# Altium footprint library SparkFun.PCBLIB: 674 footprints (part 10 of 44)
Each footprint in its own frame and in the unit in brackets; x right, y up, seen from the top. Pads: shape width x height; smd on the part's side, far side on the other; paste and mask are expansions set on the pad; w line width, h text height; cw(c..) or ccw(c..) is an arc to the next point about the centre after c.
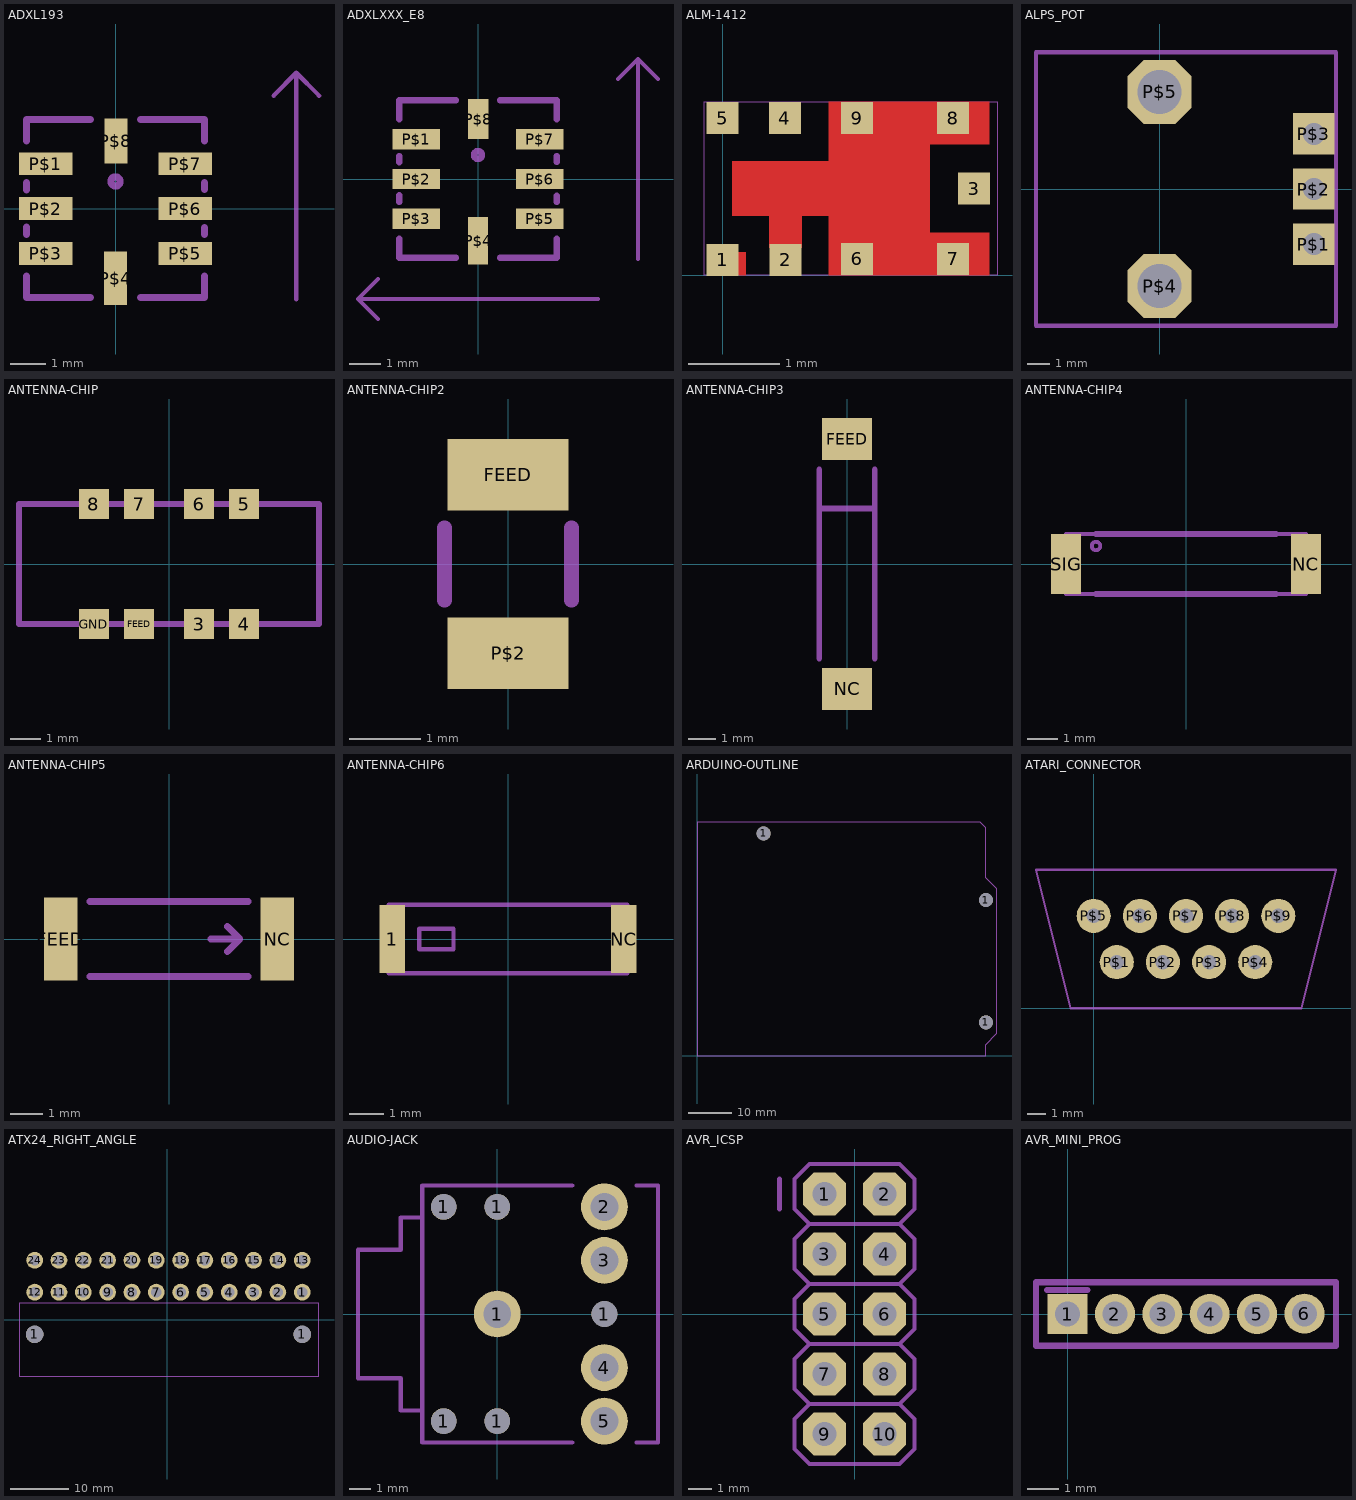
[diagram p9: the footprints below, top view; thin cyan lines are the x and y axes]

## ADXL193 [mil]
pads (8):
  rect 59.06x25.2 smd: P$1(-77.17,49.61) P$2(-77.17,0) P$3(-77.17,-49.61) P$5(77.17,-49.61) P$6(77.17,0) P$7(77.17,49.61)
  rect 25.2x59.06 smd: P$4(0,-77.17)
  rect 25.2x50 smd: P$8(0.39,74.8)
Mechanical 2:
  circle w8: c0,30 r5
  lines w8: -98.43,-74.8 -98.43,-98.43 -27.56,-98.43 ; -98.43,-28.74 -98.43,-20.47 ; -98.43,20.87 -98.43,28.74 ; -98.43,74.8 -98.43,98.43 -27.56,98.43 ; 27.56,-98.43 98.43,-98.43 98.43,-74.8 ; 27.56,98.43 98.43,98.43 98.43,74.8 ; 98.43,-28.74 98.43,-20.87 ; 98.43,21.26 98.43,28.74
Mechanical 18:
  lines w5: 175,125 200,150 ; 200,-100 200,150 ; 225,125 200,150

## ADXLXXX_E8 [mil]
pads (8):
  rect 59.06x25.2 smd: P$1(-77.17,49.61) P$2(-77.17,0) P$3(-77.17,-49.61) P$5(77.17,-49.61) P$6(77.17,0) P$7(77.17,49.61)
  rect 25.2x59.06 smd: P$4(0,-77.17)
  rect 25.2x50 smd: P$8(0.39,74.8)
Mechanical 2:
  circle w8: c0,30 r5
  lines w8: -98.43,-74.8 -98.43,-98.43 -27.56,-98.43 ; -98.43,-28.74 -98.43,-20.47 ; -98.43,20.87 -98.43,28.74 ; -98.43,74.8 -98.43,98.43 -27.56,98.43 ; 27.56,-98.43 98.43,-98.43 98.43,-74.8 ; 27.56,98.43 98.43,98.43 98.43,74.8 ; 98.43,-28.74 98.43,-20.87 ; 98.43,21.26 98.43,28.74
Mechanical 18:
  lines w5: -125,-175 -150,-150 ; -125,-125 -150,-150 ; 150,-150 -150,-150 ; 175,125 200,150 ; 200,-100 200,150 ; 225,125 200,150

## ALM-1412 [mm]
pads (9):
  rect 0.35x0.35 smd: 1(0,0.17) 2(0.69,0.17) 3(2.75,0.95) 4(0.68,1.72) 5(0,1.72)
  rect 0.35x0.35 smd paste-0.175: 6(1.47,0.18) 7(2.52,0.18) 8(2.52,1.72) 9(1.47,1.72)
Top Layer:
  rectangle: 1.16,1.43 2.92,1.9
  rectangle: 1.16,0 2.92,0.47
  rectangle: 1.16,0.4 2.27,1.5
  rectangle: 0.1,0.65 1.76,1.25
  rectangle: 0.508,0.3 0.867,0.7
  region: 0,0 0.254,0 0.254,0.254 0,0.254
Top Paste:
  rectangle: 1.33,1.585 1.61,1.895
  rectangle: 1.86,1.585 2.12,1.895
  rectangle: 2.37,1.51 2.67,1.89
  rectangle: 1.33,0.005 1.61,0.315
  rectangle: 1.86,0.005 2.12,0.315
  rectangle: 2.37,0.01 2.67,0.39
  rectangle: 1.86,0.64 2.12,1.26
  rectangle: -0.005,0.7 0.545,1.2
  rectangle: 0.79,0.64 1.61,1.26
Top Solder:
  rectangle: 1.09,1.43 3,2
  rectangle: 1.09,-0.11 3,0.47
  rectangle: 1.09,0.47 2.27,1.43
  rectangle: -0.28,0.57 1.09,1.34
Mechanical 18:
  lines w0.01: -0.2,0 -0.2,1.9 3,1.9 3,0 -0.2,0

## ALPS_POT [mm]
pads (5):
  rect 1.88x1.88 hole 1: P$1(7,-2.5) P$2(7,0) P$3(7,2.5)
  oct 2.905x2.905 hole 2: P$4(0,-4.4) P$5(0,4.4)
Mechanical 2:
  lines w0.203: -5.6,-6.2 8,-6.2 8,6.2 -5.6,6.2 -5.6,-6.2

## ANTENNA-CHIP [mm]
pads (8):
  rect 1x1 smd: 3(1,-2) 4(2.5,-2) 5(2.5,2) 6(1,2) 7(-1,2) 8(-2.5,2) FEED(-1,-2) GND(-2.5,-2)
Mechanical 2:
  lines w0.203: -5,-2 5,-2 5,2 -5,2 -5,-2

## ANTENNA-CHIP2 [mm]
pads (2):
  rect 1.7x1 smd: FEED(0,1.25) P$2(0,-1.25)
Mechanical 2:
  lines w0.203: -0.889,-0.508 -0.889,0.508 ; 0.889,-0.508 0.889,0.508

## ANTENNA-CHIP3 [mil]
pads (2):
  rect 70.87x59.06 smd: FEED(0,177.17) NC(0,-177.17)
Mechanical 2:
  lines w8: -39.37,-133.86 -39.37,78.74 ; -39.37,133.86 -39.37,78.74 ; 39.37,-133.86 39.37,78.74 ; 39.37,133.86 39.37,78.74 ; -39.37,78.74 39.37,78.74

## ANTENNA-CHIP4 [mm]
pads (2):
  rect 1x2 smd: NC(4,0) SIG(-4,0)
Mechanical 2:
  circle w0.127: c-3,0.6 r0.141
  lines w0.203: -3,-1 3,-1 ; -3,1 3,1
Mechanical 18:
  lines w0.127: -4,-1 -4,1 4,1 4,-1 -4,-1

## ANTENNA-CHIP5 [mil]
pads (2):
  rect 40x100 smd: FEED(-130,0) NC(130,0)
Mechanical 2:
  lines w8: -95,-45 95,-45 ; -95,45 95,45 ; 50,0 85,0 ; 70,-15 85,0 ; 70,15 85,0

## ANTENNA-CHIP6 [mm]
pads (2):
  rect 0.75x2 smd: 1(-3.4,0) NC(3.4,0)
Mechanical 2:
  lines w0.127: -2.7,-1 2.7,-1 ; -2.7,1 2.7,1 ; -2.6,-0.3 -2.6,0.3 -1.6,0.3 -1.6,-0.3 -2.6,-0.3
Mechanical 18:
  lines w0.127: -3.5,-1 3.5,-1 3.5,1 -3.5,1 -3.5,-1

## ARDUINO-OUTLINE [mil]
pads (3):
  round 125.98 hole 125.98: 1(600,2000) 1(2600,300) 1(2600,1400)
Mechanical 1:
  lines w8: 0,0 0,2100 2550,2100 2600,2050 2600,1600 2700,1500 2700,200 2600,100 2600,0 0,0

## ATARI_CONNECTOR [mil]
pads (9):
  round 74 hole 31.5: P$1(50,100) P$2(150,100) P$3(250,100) P$4(350,100) P$5(0,200) P$6(100,200) P$7(200,200) P$8(300,200) P$9(400,200)
Mechanical 2:
  lines w5: -125,300 525,300 450,0 -50,0 -125,300

## ATX24_RIGHT_ANGLE [mm]
pads (26):
  round 3 hole 3: 1(-22.86,-2.54) 1(23.34,-2.54)
  round 2.9 hole 1.8: 1(23.34,4.76) 2(19.14,4.76) 3(14.94,4.76) 4(10.74,4.76) 5(6.54,4.76) 6(2.34,4.76) 7(-1.86,4.76) 8(-6.06,4.76) 9(-10.26,4.76) 10(-14.46,4.76) 11(-18.66,4.76) 12(-22.86,4.76) 13(23.34,10.26) 14(19.14,10.26) 15(14.94,10.26) 16(10.74,10.26) 17(6.54,10.26) 18(2.34,10.26) 19(-1.86,10.26) 20(-6.06,10.26) 21(-10.26,10.26) 22(-14.46,10.26) 23(-18.66,10.26) 24(-22.86,10.26)
Mechanical 2:
  lines w0.203: -25.56,-9.74 -25.56,2.86 26.24,2.86 26.24,-9.74 -25.26,-9.74
Mechanical 18:
  lines w0.203: -25.56,-9.74 -25.26,-9.74

## AUDIO-JACK [mm]
pads (10):
  round 1.2 hole 1.2: 1(-2.5,-5) 1(-2.5,5) 1(0,-5) 1(0,5) 1(5,0)
  round 2.184 hole 1.3: 1(0,0) 2(5,5) 3(5,2.5) 4(5,-2.5) 5(5,-5)
Mechanical 2:
  lines w0.203: 3.5,-6 -3.5,-6 -3.5,6 3.5,6 ; 6.5,-6 7.5,-6 7.5,6 6.5,6
Mechanical 18:
  lines w0.203: -3.5,-6 -3.5,-4.5 -4.5,-4.5 -4.5,-3 -6.5,-3 -6.5,3 -4.5,3 -4.5,4.5 -3.5,4.5 -3.5,6

## AVR_ICSP [mil]
pads (10):
  oct 71.65x71.65 hole 40: 1(-50,200) 2(50,200) 3(-50,100) 4(50,100) 5(-50,0) 6(50,0) 7(-50,-100) 8(50,-100) 9(-50,-200) 10(50,-200)
Mechanical 2:
  rectangle: -60,-10 -40,10
  lines w6: -75,-150 -100,-125 -100,-75 -75,-50 ; -75,-150 75,-150 ; -75,-150 -100,-175 -100,-225 -75,-250 75,-250 100,-225 100,-175 75,-150 ; -75,-50 -100,-25 -100,25 -75,50 ; -75,-50 75,-50 ; -75,50 -100,75 -100,125 -75,150 ; -75,50 75,50 ; -75,150 -100,175 -100,225 -75,250 75,250 100,225 100,175 75,150 ; -75,150 75,150 ; 75,-150 100,-125 100,-75 75,-50 ; 75,-50 100,-25 100,25 75,50 ; 75,50 100,75 100,125 75,150
  lines w8: -125,175 -125,225
Mechanical 18:
  rectangle: -60,190 -40,210
  rectangle: 40,190 60,210
  rectangle: 40,90 60,110
  rectangle: -60,90 -40,110
  rectangle: 40,-10 60,10
  rectangle: 40,-210 60,-190
  rectangle: -60,-210 -40,-190
  rectangle: -60,-110 -40,-90
  rectangle: 40,-110 60,-90

## AVR_MINI_PROG [mil]
pads (6):
  rect 50x50 hole 31.5: 1(0,0)
  round 50 hole 31.5: 2(59.06,0) 3(118.11,0) 4(177.17,0) 5(236.22,0) 6(295.28,0.39)
Mechanical 2:
  lines w8: -25.59,29.92 24.41,29.92 ; -39.37,-39.37 -39.37,39.37 334.65,39.37 334.65,-39.37 -39.37,-39.37